# Altium footprint library Boards.PcbLib: 1 footprints
Each footprint in its own frame and in the unit in brackets; x right, y up, seen from the top. Pads: shape width x height; smd on the part's side, far side on the other; paste and mask are expansions set on the pad; w line width, h text height; cw(c..) or ccw(c..) is an arc to the next point about the centre after c.
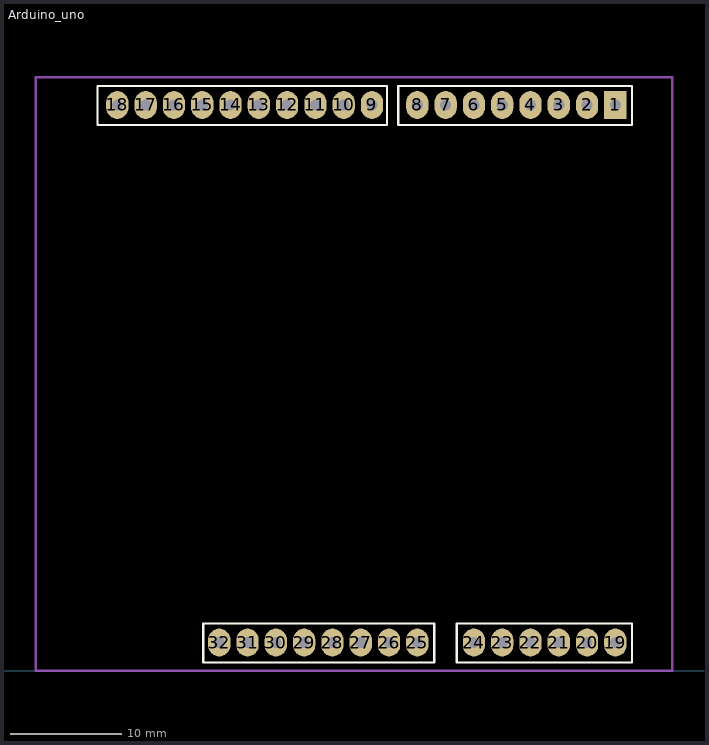
[diagram p0: the footprint, top view; thin cyan lines are the x and y axes]

## Arduino_uno [mm]
pads (32):
  rect 2x2.5 hole 1 mask+0.15: 1(63.5,50.8)
  oval 2x2.5 hole 1 mask+0.15: 2(60.96,50.8) 3(58.42,50.8) 4(55.88,50.8) 5(53.34,50.8) 6(50.8,50.8) 7(48.26,50.8) 8(45.72,50.8) 9(41.65,50.8) 10(39.11,50.8) 11(36.57,50.8) 12(34.03,50.8) 13(31.49,50.8) 14(28.95,50.8) 15(26.41,50.8) 16(23.87,50.8) 17(21.33,50.8) 18(18.79,50.8) 19(63.5,2.54) 20(60.96,2.54) 21(58.42,2.54) 22(55.88,2.54) 23(53.34,2.54) 24(50.8,2.54) 25(45.72,2.54) 26(43.18,2.54) 27(40.64,2.54) 28(38.1,2.54) 29(35.56,2.54) 30(33.02,2.54) 31(30.48,2.54) 32(27.94,2.54)
Top Overlay:
  lines w0.2: 17,49 43,49 43,52.5 17,52.5 17,49 ; 26.5,0.75 26.5,4.25 47.25,4.25 47.25,0.75 26.5,0.75 ; 44,49 65,49 65,52.5 44,52.5 44,49 ; 49.25,0.75 49.25,4.25 65,4.25 65,0.75 49.25,0.75
Mechanical 13:
  lines w0.2: 11.471,0 68.6,0 68.6,53.3 11.471,53.3 11.471,0
3D body "User Library-arduino_uno_10 PORT HEADER.stp": height 8.51, standoff -2, extent 17.53,49.595 42.93,52.005
3D body "User Library-arduino_uno_8 PORT HEADER.stp": height 8.51, standoff -2, extent 44.44,49.59 64.76,52
3D body "User Library-arduino_uno_8 PORT HEADER.stp": height 8.51, standoff -2, extent 26.68,1.325 47,3.735
3D body "User Library-arduino_uno_6 PORT HEADER.stp": height 8.51, standoff -2, extent 49.53,1.325 64.77,3.735
3D body "User Library-arduino_uno.STEP": height 0.85, standoff -14.4, extent -6.35,0 68.58,53.34